# Altium footprint library PCBLIB.PcbLib: 775 footprints (part 46 of 49)
Each footprint in its own frame and in the unit in brackets; x right, y up, seen from the top. Pads: shape width x height; smd on the part's side, far side on the other; paste and mask are expansions set on the pad; w line width, h text height; cw(c..) or ccw(c..) is an arc to the next point about the centre after c.
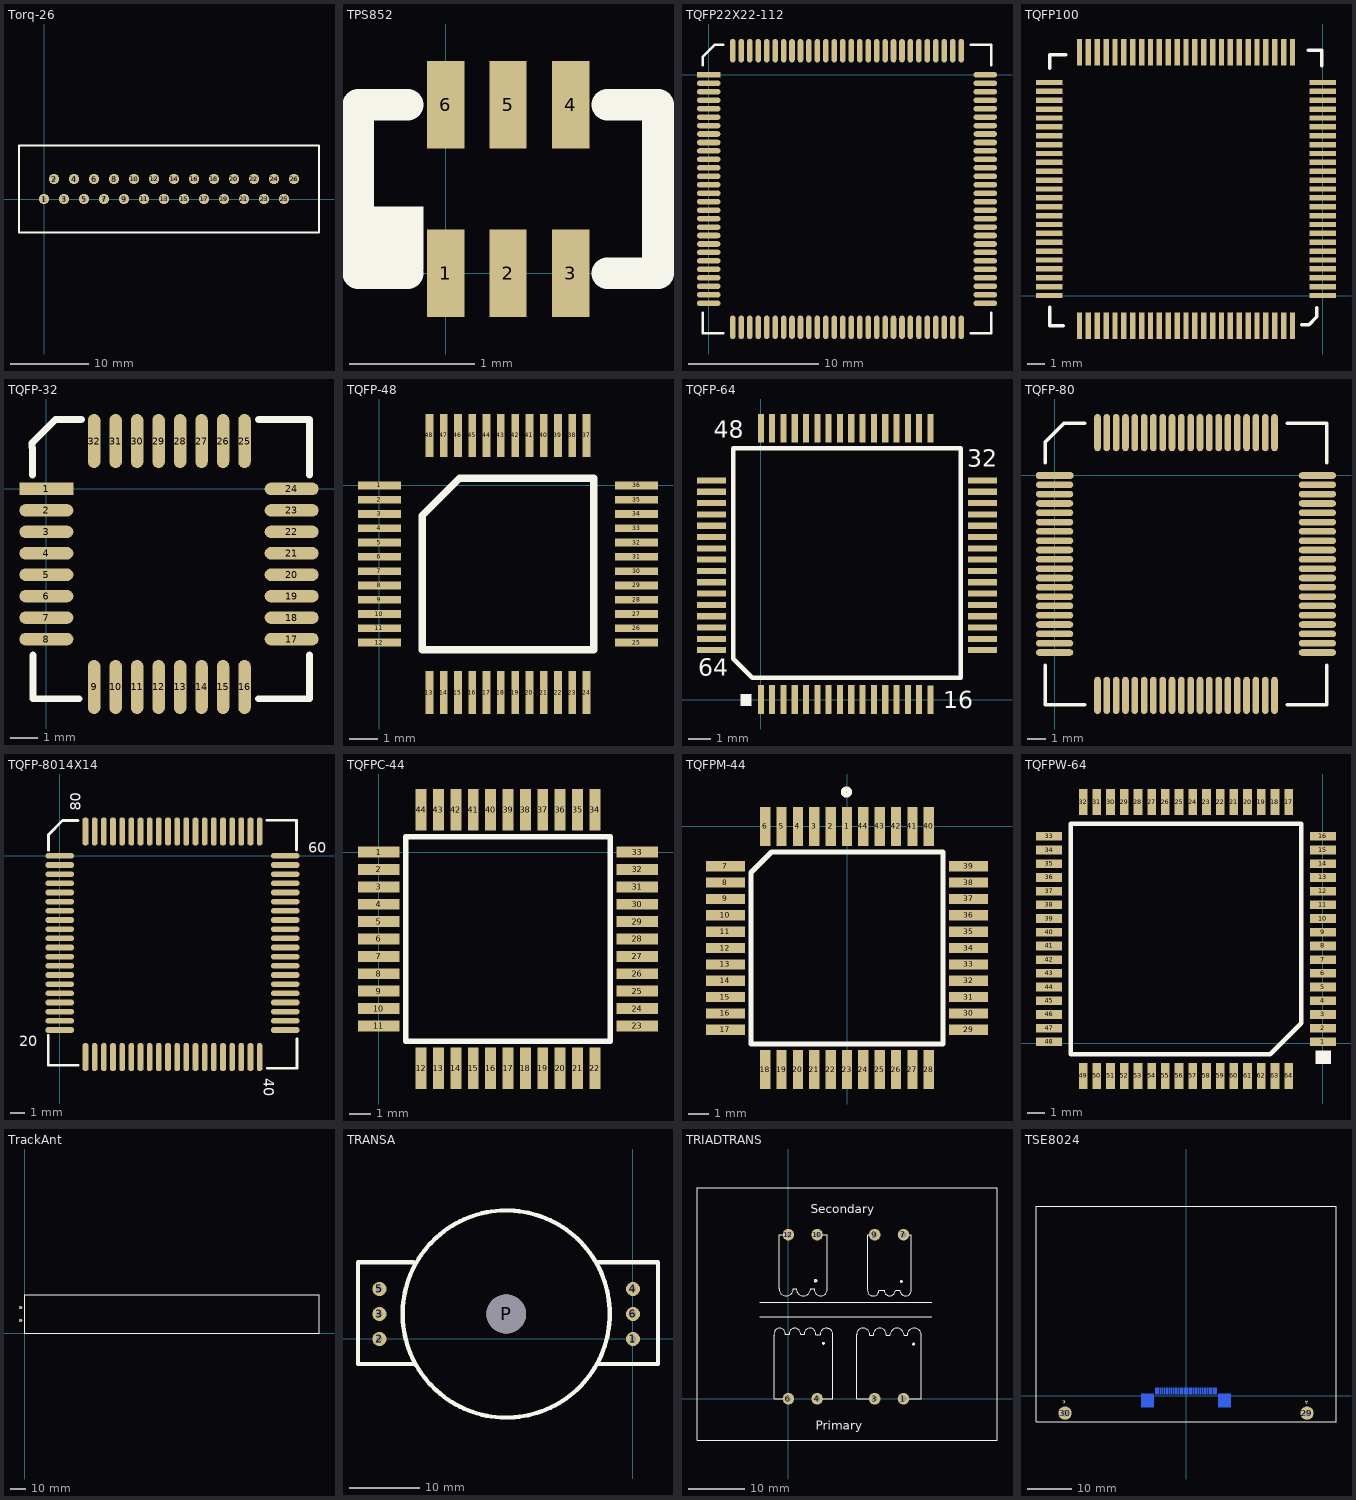
[diagram p45: the footprints below, top view; thin cyan lines are the x and y axes]

## Torq-26 [mil]
pads (26):
  round 52 hole 22: 1(0,0) 2(50,100) 3(100,0) 4(150,100) 5(200,0) 6(250,100) 7(300,0) 8(350,100) 9(400,0) 10(450,100) 11(500,0) 12(550,100) 13(600,0) 14(650,100) 15(700,0) 16(750,100) 17(800,0) 18(850,100) 19(900,0) 20(950,100) 21(1000,0) 22(1050,100) 23(1100,0) 24(1150,100) 25(1200,0) 26(1250,100)
TopOverlay:
  lines w10: -125,-168 1375,-168 1375,268 -125,268 -125,-168

## TPS852 [mm] "Photodiode"
height 0.55
pads (7):
  rect 0.3x0.7 smd: 1(0,0) 2(0.5,0) 3(1,0) 4(1,1.35) 5(0.5,1.35) 6(0,1.35)
  rect 0.508x0.508 on Top Overlay: ""(-0.432,0.279)
TopOverlay:
  lines w0.254: -0.305,0 -0.7,0 -0.7,1.35 -0.305,1.35 ; 1.295,0 1.7,0 1.7,1.35 1.295,1.35

## TQFP22X22-112 [mil]
pads (112):
  rect 71x17 smd: 1(0,0)
  oval 71x17 smd: 2(0,-25.59) 3(0,-51.18) 4(0,-76.77) 5(0,-102.36) 6(0,-127.95) 7(0,-153.54) 8(0,-179.13) 9(0,-204.72) 10(0,-230.31) 11(0,-255.91) 12(0,-281.5) 13(0,-307.09) 14(0,-332.68) 15(0,-358.27) 16(0,-383.86) 17(0,-409.45) 18(0,-435.04) 19(0,-460.63) 20(0,-486.22) 21(0,-511.81) 22(0,-537.4) 23(0,-562.99) 24(0,-588.58) 25(0,-614.17) 26(0,-639.76) 27(0,-665.36) 28(0,-690.95) 57(836.62,-690.95) 58(836.62,-665.36) 59(836.62,-639.76) 60(836.62,-614.17) 61(836.62,-588.58) 62(836.62,-562.99) 63(836.62,-537.4) 64(836.62,-511.81) 65(836.62,-486.22) 66(836.62,-460.63) 67(836.62,-435.04) 68(836.62,-409.45) 69(836.62,-383.86) 70(836.62,-358.27) 71(836.62,-332.68) 72(836.62,-307.09) 73(836.62,-281.5) 74(836.62,-255.91) 75(836.62,-230.31) 76(836.62,-204.72) 77(836.62,-179.13) 78(836.62,-153.54) 79(836.62,-127.95) 80(836.62,-102.36) 81(836.62,-76.77) 82(836.62,-51.18) 83(836.62,-25.59) 84(836.62,0)
  oval 17x71 smd: 29(72.83,-763.78) 30(98.42,-763.78) 31(124.02,-763.78) 32(149.61,-763.78) 33(175.2,-763.78) 34(200.79,-763.78) 35(226.38,-763.78) 36(251.97,-763.78) 37(277.56,-763.78) 38(303.15,-763.78) 39(328.74,-763.78) 40(354.33,-763.78) 41(379.92,-763.78) 42(405.51,-763.78) 43(431.1,-763.78) 44(456.69,-763.78) 45(482.28,-763.78) 46(507.88,-763.78) 47(533.47,-763.78) 48(559.06,-763.78) 49(584.65,-763.78) 50(610.24,-763.78) 51(635.83,-763.78) 52(661.42,-763.78) 53(687.01,-763.78) 54(712.6,-763.78) 55(738.19,-763.78) 56(763.78,-763.78) 85(763.78,72.83) 86(738.19,72.83) 87(712.6,72.83) 88(687.01,72.83) 89(661.42,72.83) 90(635.83,72.83) 91(610.24,72.83) 92(584.65,72.83) 93(559.06,72.83) 94(533.47,72.83) 95(507.88,72.83) 96(482.28,72.83) 97(456.69,72.83) 98(431.1,72.83) 99(405.51,72.83) 100(379.92,72.83) 101(354.33,72.83) 102(328.74,72.83) 103(303.15,72.83) 104(277.56,72.83) 105(251.97,72.83) 106(226.38,72.83) 107(200.79,72.83) 108(175.2,72.83) 109(149.61,72.83) 110(124.02,72.83) 111(98.42,72.83) 112(72.83,72.83)
TopOverlay:
  lines w8: -17.72,-720.47 -17.72,-781.5 43.31,-781.5 ; -17.72,29.53 -17.72,55.12 17.72,90.55 43.31,90.55 ; 793.31,-781.5 854.33,-781.5 854.33,-720.47 ; 793.31,90.55 854.33,90.55 854.33,29.53
Mechanical4:
  text ".047" at 0,0 h1
  text ".065" at 0.23,0 h1

## TQFP100 [mm]
pads (100):
  rect 1.5x0.3 smd: 1(0,0) 2(0,0.5) 3(0,1) 4(0,1.5) 5(0,2) 6(0,2.5) 7(0,3) 8(0,3.5) 9(0,4) 10(0,4.5) 11(0,5) 12(0,5.5) 13(0,6) 14(0,6.5) 15(0,7) 16(0,7.5) 17(0,8) 18(0,8.5) 19(0,9) 20(0,9.5) 21(0,10) 22(0,10.5) 23(0,11) 24(0,11.5) 25(0,12) 51(-15.4,12) 52(-15.4,11.5) 53(-15.4,11) 54(-15.4,10.5) 55(-15.4,10) 56(-15.4,9.5) 57(-15.4,9) 58(-15.4,8.5) 59(-15.4,8) 60(-15.4,7.5) 61(-15.4,7) 62(-15.4,6.5) 63(-15.4,6) 64(-15.4,5.5) 65(-15.4,5) 66(-15.4,4.5) 67(-15.4,4) 68(-15.4,3.5) 69(-15.4,3) 70(-15.4,2.5) 71(-15.4,2) 72(-15.4,1.5) 73(-15.4,1) 74(-15.4,0.5) 75(-15.4,0)
  rect 0.3x1.5 smd: 26(-1.7,13.7) 27(-2.2,13.7) 28(-2.7,13.7) 29(-3.2,13.7) 30(-3.7,13.7) 31(-4.2,13.7) 32(-4.7,13.7) 33(-5.2,13.7) 34(-5.7,13.7) 35(-6.2,13.7) 36(-6.7,13.7) 37(-7.2,13.7) 38(-7.7,13.7) 39(-8.2,13.7) 40(-8.7,13.7) 41(-9.2,13.7) 42(-9.7,13.7) 43(-10.2,13.7) 44(-10.7,13.7) 45(-11.2,13.7) 46(-11.7,13.7) 47(-12.2,13.7) 48(-12.7,13.7) 49(-13.2,13.7) 50(-13.7,13.7) 76(-13.7,-1.7) 77(-13.2,-1.7) 78(-12.7,-1.7) 79(-12.2,-1.7) 80(-11.7,-1.7) 81(-11.2,-1.7) 82(-10.7,-1.7) 83(-10.2,-1.7) 84(-9.7,-1.7) 85(-9.2,-1.7) 86(-8.7,-1.7) 87(-8.2,-1.7) 88(-7.7,-1.7) 89(-7.2,-1.7) 90(-6.7,-1.7) 91(-6.2,-1.7) 92(-5.7,-1.7) 93(-5.2,-1.7) 94(-4.7,-1.7) 95(-4.2,-1.7) 96(-3.7,-1.7) 97(-3.2,-1.7) 98(-2.7,-1.7) 99(-2.2,-1.7) 100(-1.7,-1.7)
TopOverlay:
  lines w0.2: -15.375,-0.65 -15.375,-1.7 -14.625,-1.7 ; -15.375,12.8 -15.375,13.575 -14.475,13.575 ; -1.175,-1.65 -0.775,-1.65 -0.325,-1.2 -0.325,-0.7 ; -0.825,13.825 -0.05,13.825 -0.05,12.95
  text "." at 0.551,-0.956 h2.03
Mechanical4:
  text ".040" at 0,0 h0.03

## TQFP-32 [mil]
pads (32):
  rect 78x18 smd: 1(0,0)
  oval 78x18 smd: 2(0,-31) 3(0,-62) 4(0,-93) 5(0,-124) 6(0,-155) 7(0,-186) 8(0,-217) 17(354,-217) 18(354,-186) 19(354,-155) 20(354,-124) 21(354,-93) 22(354,-62) 23(354,-31) 24(354,0)
  oval 18x78 smd: 9(69,-286) 10(100,-286) 11(131,-286) 12(162,-286) 13(193,-286) 14(224,-286) 15(255,-286) 16(286,-286) 25(286,69) 26(255,69) 27(224,69) 28(193,69) 29(162,69) 30(131,69) 31(100,69) 32(69,69)
TopOverlay:
  lines w10: -20,20 -20,59 -21,60 -21,66 13,100 51,100 ; -19,-240 -19,-303 47,-303 ; 306,-303 380,-303 380,-240 ; 306,100 380,100 380,20
  text "." at -80,20 h60
Mechanical4:
  text ".047" at 0,0 h1

## TQFP-48 [mm]
pads (48):
  rect 1.5x0.27 smd: 1(0,0) 2(0,-0.5) 3(0,-1) 4(0,-1.5) 5(0,-2) 6(0,-2.5) 7(0,-3) 8(0,-3.5) 9(0,-4) 10(0,-4.5) 11(0,-5) 12(0,-5.5) 25(9,-5.5) 26(9,-5) 27(9,-4.5) 28(9,-4) 29(9,-3.5) 30(9,-3) 31(9,-2.5) 32(9,-2) 33(9,-1.5) 34(9,-1) 35(9,-0.5) 36(9,0)
  rect 0.27x1.5 smd: 13(1.75,-7.25) 14(2.25,-7.25) 15(2.75,-7.25) 16(3.25,-7.25) 17(3.75,-7.25) 18(4.25,-7.25) 19(4.75,-7.25) 20(5.25,-7.25) 21(5.75,-7.25) 22(6.25,-7.25) 23(6.75,-7.25) 24(7.25,-7.25) 37(7.25,1.75) 38(6.75,1.75) 39(6.25,1.75) 40(5.75,1.75) 41(5.25,1.75) 42(4.75,1.75) 43(4.25,1.75) 44(3.75,1.75) 45(3.25,1.75) 46(2.75,1.75) 47(2.25,1.75) 48(1.75,1.75)
TopOverlay:
  lines w0.254: 1.5,-5.75 7.5,-5.75 7.5,0.25 2.8,0.25 1.5,-1.05 1.5,-5.75
  text "." at 0.025,0.711 h0.5

## TQFP-64 [mm]
height 2.032
pads (64):
  rect 0.27x1.27 smd: 1(0,0) 2(0.5,0) 3(1,0) 4(1.5,0) 5(2,0) 6(2.5,0) 7(3,0) 8(3.5,0) 9(4,0) 10(4.5,0) 11(5,0) 12(5.5,0) 13(6,0.003) 14(6.5,0) 15(7,0) 16(7.5,-0.004) 33(7.5,11.988) 34(7,11.988) 35(6.5,11.988) 36(6,11.988) 37(5.5,11.988) 38(5,11.988) 39(4.5,11.988) 40(4,11.988) 41(3.5,11.988) 42(3,11.988) 43(2.5,11.988) 44(2,11.988) 45(1.5,11.988) 46(1,11.988) 47(0.5,11.988) 48(0,11.988)
  rect 1.27x0.27 smd: 17(9.804,2.184) 18(9.804,2.684) 19(9.804,3.184) 20(9.804,3.684) 21(9.804,4.184) 22(9.804,4.684) 23(9.804,5.184) 24(9.804,5.684) 25(9.804,6.184) 26(9.804,6.684) 27(9.804,7.184) 28(9.804,7.684) 29(9.804,8.184) 30(9.804,8.684) 31(9.804,9.184) 32(9.804,9.684) 49(-2.184,9.684) 50(-2.184,9.184) 51(-2.184,8.684) 52(-2.184,8.184) 53(-2.184,7.684) 54(-2.184,7.184) 55(-2.184,6.684) 56(-2.184,6.184) 57(-2.184,5.684) 58(-2.184,5.184) 59(-2.184,4.684) 60(-2.184,4.184) 61(-2.184,3.684) 62(-2.184,3.184) 63(-2.184,2.684) 64(-2.184,2.184)
TopOverlay:
  rectangle: -0.901,-0.283 -0.403,0.242
  lines w0.2: -1.222,1.803 -1.221,11.104 8.838,11.104 ; -1.219,1.803 -0.381,0.965 8.839,0.965 8.839,10.237
  lines w0.203: 8.839,10.237 8.839,11.102
  text "64" at -2.766,1.044 h0.76
  text "48" at -2.084,11.566 h0.76
  text "32" at 9.121,10.289 h0.76
  text "16" at 8.054,-0.378 h0.76
  text "." at -0.127,1.422 h1.52

## TQFP-80 [mm]
height 2.032
pads (80):
  oct 2x0.356 smd: 1(0,0)
  oval 2x0.356 smd: 2(0,-0.5) 3(0,-1) 4(0,-1.5) 5(0,-2) 6(0,-2.5) 7(0,-3) 8(0,-3.5) 9(0,-4) 10(0,-4.5) 11(0,-5) 12(0,-5.5) 13(0,-6) 14(0,-6.5) 15(0,-7) 16(0,-7.5) 17(0,-8) 18(0,-8.5) 19(0,-9) 20(0,-9.5) 41(14.1,-9.5) 42(14.1,-9) 43(14.1,-8.5) 44(14.1,-8) 45(14.1,-7.5) 46(14.1,-7) 47(14.1,-6.5) 48(14.1,-6) 49(14.1,-5.5) 50(14.1,-5) 51(14.1,-4.5) 52(14.1,-4) 53(14.1,-3.5) 54(14.1,-3) 55(14.1,-2.5) 56(14.1,-2) 57(14.1,-1.5) 58(14.1,-1) 59(14.1,-0.5) 60(14.1,0)
  oval 0.356x2 smd: 21(2.3,-11.8) 22(2.8,-11.8) 23(3.3,-11.8) 24(3.8,-11.8) 25(4.3,-11.8) 26(4.8,-11.8) 27(5.3,-11.8) 28(5.8,-11.8) 29(6.3,-11.8) 30(6.8,-11.8) 31(7.3,-11.8) 32(7.8,-11.8) 33(8.3,-11.8) 34(8.8,-11.8) 35(9.3,-11.8) 36(9.8,-11.8) 37(10.3,-11.8) 38(10.8,-11.8) 39(11.3,-11.8) 40(11.8,-11.8) 61(11.8,2.3) 62(11.3,2.3) 63(10.8,2.3) 64(10.3,2.3) 65(9.8,2.3) 66(9.3,2.3) 67(8.8,2.3) 68(8.3,2.3) 69(7.8,2.3) 70(7.3,2.3) 71(6.8,2.3) 72(6.3,2.3) 73(5.8,2.3) 74(5.3,2.3) 75(4.8,2.3) 76(4.3,2.3) 77(3.8,2.3) 78(3.3,2.3) 79(2.8,2.3) 80(2.3,2.3)
TopOverlay:
  lines w0.2: -0.5,-10.2 -0.5,-12.3 1.6,-12.3 ; -0.5,0.7 -0.5,1.8 0.5,2.8 1.6,2.8 ; 12.5,-12.3 14.6,-12.3 14.6,-10.2 ; 12.5,2.8 14.6,2.8 14.6,0.7
Mechanical4:
  text ".047" at 0,0 h0.03

## TQFP-8014X14 [mm]
height 3.048
pads (80):
  oct 2x0.4 smd: 1(0,0) 2(0,-0.65) 3(0,-1.3) 4(0,-1.95) 5(0,-2.6) 6(0,-3.25) 7(0,-3.9) 8(0,-4.55) 9(0,-5.2) 10(0,-5.85) 11(0,-6.5) 12(0,-7.15) 13(0,-7.8) 14(0,-8.45) 15(0,-9.1) 16(0,-9.75) 17(0,-10.4) 18(0,-11.05) 19(0,-11.7) 20(0,-12.35) 41(16,-12.35) 42(16,-11.7) 43(16,-11.05) 44(16,-10.4) 45(16,-9.75) 46(16,-9.1) 47(16,-8.45) 48(16,-7.8) 49(16,-7.15) 50(16,-6.5) 51(16,-5.85) 52(16,-5.2) 53(16,-4.55) 54(16,-3.9) 55(16,-3.25) 56(16,-2.6) 57(16,-1.95) 58(16,-1.3) 59(16,-0.65) 60(16,0)
  oct 0.4x2 smd: 21(1.825,-14.275) 22(2.475,-14.275) 23(3.125,-14.275) 24(3.775,-14.275) 25(4.425,-14.275) 26(5.075,-14.275) 27(5.725,-14.275) 28(6.375,-14.275) 29(7.025,-14.275) 30(7.675,-14.275) 31(8.325,-14.275) 32(8.975,-14.275) 33(9.625,-14.275) 34(10.275,-14.275) 35(10.925,-14.275) 36(11.575,-14.275) 37(12.225,-14.275) 38(12.875,-14.275) 39(13.525,-14.275) 40(14.175,-14.275) 61(14.175,1.727) 62(13.525,1.727) 63(12.875,1.727) 64(12.225,1.727) 65(11.575,1.727) 66(10.925,1.727) 67(10.275,1.727) 68(9.625,1.727) 69(8.975,1.727) 70(8.325,1.727) 71(7.675,1.727) 72(7.025,1.727) 73(6.375,1.727) 74(5.725,1.727) 75(5.075,1.727) 76(4.425,1.727) 77(3.775,1.727) 78(3.125,1.727) 79(2.475,1.727) 80(1.825,1.727)
TopOverlay:
  lines w0.2: -0.813,-12.751 -0.813,-14.851 1.287,-14.851 ; -0.805,0.395 -0.805,1.495 0.195,2.495 1.295,2.495 ; 14.684,2.521 16.784,2.521 16.784,0.421 ; 14.735,-15.069 16.835,-15.069 16.835,-12.969
  text "." at -1.981,-0.102 h1.27
  text "20" at -2.887,-13.509 h0.76
  text "40" at 14.475,-15.771 h0.76
  text "60" at 17.624,0.217 h0.76
  text "80" at 1.503,3.211 h0.76
Mechanical4:
  text ".047" at 0,0 h0.03

## TQFPC-44 [mm]
pads (44):
  rect 1.9x0.5 smd: 1(0,0) 2(0,-0.8) 3(0,-1.6) 4(0,-2.4) 5(0,-3.2) 6(0,-4) 7(0,-4.8) 8(0,-5.6) 9(0,-6.4) 10(0,-7.2) 11(0,-8) 23(11.9,-8) 24(11.9,-7.2) 25(11.9,-6.4) 26(11.9,-5.6) 27(11.9,-4.8) 28(11.9,-4) 29(11.9,-3.2) 30(11.9,-2.4) 31(11.9,-1.6) 32(11.9,-0.8) 33(11.9,0)
  rect 0.5x1.9 smd: 12(1.95,-9.95) 13(2.75,-9.95) 14(3.55,-9.95) 15(4.35,-9.95) 16(5.15,-9.95) 17(5.95,-9.95) 18(6.75,-9.95) 19(7.55,-9.95) 20(8.35,-9.95) 21(9.15,-9.95) 22(9.95,-9.95) 34(9.95,1.95) 35(9.15,1.95) 36(8.35,1.95) 37(7.55,1.95) 38(6.75,1.95) 39(5.95,1.95) 40(5.15,1.95) 41(4.35,1.95) 42(3.55,1.95) 43(2.75,1.95) 44(1.95,1.95)
TopOverlay:
  lines w0.25: 1.25,-8.7 10.65,-8.7 10.65,0.7 1.25,0.7 1.25,-8.7
  text "." at -2.207,-0.092 h1.52

## TQFPM-44 [mm]
pads (44):
  rect 0.5x1.9 smd: 1(0,0) 2(-0.8,0) 3(-1.6,0) 4(-2.4,0) 5(-3.2,0) 6(-4,0) 18(-4,-11.9) 19(-3.2,-11.9) 20(-2.4,-11.9) 21(-1.6,-11.9) 22(-0.8,-11.9) 23(0,-11.9) 24(0.8,-11.9) 25(1.6,-11.9) 26(2.4,-11.9) 27(3.2,-11.9) 28(4,-11.9) 40(4,0) 41(3.2,0) 42(2.4,0) 43(1.6,0) 44(0.8,0)
  rect 1.9x0.5 smd: 7(-5.95,-1.95) 8(-5.95,-2.75) 9(-5.95,-3.55) 10(-5.95,-4.35) 11(-5.95,-5.15) 12(-5.95,-5.95) 13(-5.95,-6.75) 14(-5.95,-7.55) 15(-5.95,-8.35) 16(-5.95,-9.15) 17(-5.95,-9.95) 29(5.95,-9.95) 30(5.95,-9.15) 31(5.95,-8.35) 32(5.95,-7.55) 33(5.95,-6.75) 34(5.95,-5.95) 35(5.95,-5.15) 36(5.95,-4.35) 37(5.95,-3.55) 38(5.95,-2.75) 39(5.95,-1.95)
TopOverlay:
  circle w0.25: c-0.029,1.682 r0.15
  lines w0.25: -4.7,-10.65 4.7,-10.65 4.7,-1.25
  lines w0.254: -4.7,-10.65 -4.7,-3.525 -4.7,-2.249 -3.701,-1.25 -2.978,-1.25 4.7,-1.25

## TQFPW-64 [mil]
height 110
pads (64):
  rect 60x20 smd: 1(0,3.5) 2(0,35) 3(0,66.5) 4(0,98) 5(0,129.5) 6(0,161) 7(0,192.5) 8(0,224) 9(0,255.5) 10(0,287) 11(0,318.5) 12(0,350) 13(0,381.5) 14(0,413) 15(0,444.5) 16(0,476) 33(-630,476) 34(-630,444.5) 35(-630,413) 36(-630,381.5) 37(-630,350) 38(-630,318.5) 39(-630,287) 40(-630,255.5) 41(-630,224) 42(-630,192.5) 43(-630,161) 44(-630,129.5) 45(-630,98) 46(-630,66.5) 47(-630,35) 48(-630,3.5)
  rect 20x60 smd: 17(-79,555) 18(-110.5,555) 19(-142,555) 20(-173.5,555) 21(-205,555) 22(-236.5,555) 23(-268,555) 24(-299.5,555) 25(-331,555) 26(-362.5,555) 27(-394,555) 28(-425.5,555) 29(-457,555) 30(-488.5,555) 31(-520,555) 32(-551.5,555) 49(-551.5,-75) 50(-520,-75) 51(-488.5,-75) 52(-457,-75) 53(-425.5,-75) 54(-394,-75) 55(-362.5,-75) 56(-331,-75) 57(-299.5,-75) 58(-268,-75) 59(-236.5,-75) 60(-205,-75) 61(-173.5,-75) 62(-142,-75) 63(-110.5,-75) 64(-79,-75)
TopOverlay:
  rectangle: -17,-48 18,-16
  lines w10: -50,67 -50,46 ; -50,46 -50,505 -580,505 -580,-25 -121,-25 -50,46

## TrackAnt [mil]
pads (2):
  round 85 hole 55: 1(-100,333) 2(-100,666)
TopOverlay:
  lines w10: 0,0 7600,0 7600,1000 0,1000 0,0

## TRANSA [mil]
pads (7):
  round 80 hole 36: 1(0,0) 2(-1420,0) 3(-1420,140) 4(0,280) 5(-1420,280) 6(0,140)
  round 221 hole 221 unplated: P(-710,140)
TopOverlay:
  circle w24: c-710,140 r580
  lines w24: -1230,-140 -1540,-140 -1540,430 -1230,430 ; -200,430 140,430 140,-140 -190,-140
  text "." at 0,-220 h90
Mechanical4:
  text ".895" at 0,0 h1

## TRIADTRANS [mil] "Transformer"
height 1375
pads (8):
  round 80 hole 40: 1(800,0) 3(600,0) 4(200,0) 6(0,0) 7(800,1140) 9(600,1140) 10(200,1140) 12(0,1140)
TopOverlay:
  circle w10: c870,380 r5
  circle w10: c245,385 r5
  circle w10: c190,820 r7.07
  circle w10: c785,815 r5
  lines w8: -200,570 995,570 ; -200,670 995,670 ; -98.81,1.19 -98.81,440.3 cw(c-60,450) -20,450 5,450 cw(c45,450) 85,450 109.69,450 cw(c150,450) 190,445 220,445 cw(c265,445) 310,445 310,0 200,0 ; -97.61,0 0,0 ; 0,1140 -65,1140 -65,765 ccw(c-15,765) 35,765 55,765 ccw(c105,765) 155,765 180,765 ccw(c225,760) 270.05,764.51 270.05,1139.95 270,1140 200,1140 ; 474.28,0.72 474.28,445 cw(c520,445) 565.49,440.49 589.95,440.49 cw(c635,445) 680,440 705,440 cw(c755,440) 805,440 825,440 cw(c875,440) 925,440 925,0 800,0 ; 475,0 600,0 ; 600,1140 550,1140 550,760 ccw(c590,755) 630.31,755 665,755 ccw(c705,755) 745,755 ; 750,755 775,755 ccw(c815,755) 853.81,764.7 853.81,1138.81 852.61,1140 800,1140 ; -635,-287 -635,1465 1450,1465 1450,-287 -635,-287
  lines w10: -98.81,1.19 -97.61,0 ; 474.28,0.72 475,0
  text "Secondary" at 155,1290 h60
  text "Primary" at 190,-215 h60

## TSE8024 [mm] "LCD Module W/ Backlight"
height 5
pads (32):
  rect 0.3x1.4 smd far side: 1(6.75,1.062) 2(6.25,1.062) 3(5.75,1.062) 4(5.25,1.062) 5(4.75,1.062) 6(4.25,1.062) 7(3.75,1.062) 8(3.25,1.062) 9(2.75,1.062) 10(2.25,1.062) 11(1.75,1.062) 12(1.25,1.062) 13(0.75,1.062) 14(0.25,1.062) 15(-0.25,1.062) 16(-0.75,1.062) 17(-1.25,1.062) 18(-1.75,1.062) 19(-2.25,1.062) 20(-2.75,1.062) 21(-3.25,1.062) 22(-3.75,1.062) 23(-4.25,1.062) 24(-4.75,1.062) 25(-5.25,1.062) 26(-5.75,1.062) 27(-6.25,1.062) 28(-6.75,1.062)
  round 3 hole 1.5: 29(27.1,-3.9) 30(-27.1,-3.9)
  rect 2.794x3.05 smd far side: ""(-8.65,-1.062) ""(8.65,-1.062)
TopOverlay:
  lines w0.254: -33.6,-5.8 33.6,-5.8 33.6,42.4 -33.6,42.4 -33.6,-5.8
  text "A" at 27.33,-1.168 h0.76
  text "K" at -26.924,-1.016 h0.76
BottomOverlay:
  lines w0.254: -8.65,-2.798 -8.65,-4.238 8.65,-4.238 8.65,-2.798 ; -8.642,0.612 -8.65,1.062 -7.45,1.062 ; 7.45,1.062 8.65,1.062 8.65,0.612
  text "A" at 26.822,-1.194 h0.76
  text "K" at -27.432,-1.041 h0.76